# Altium footprint library SAMTEC THD.PcbLib: 161 footprints (part 12 of 12) (continued)
## SAMTEC_TSW-120-08-L-D-RA [mm] "40 Contacts - Pitch 2.54mm - Dual Row Through Mount  Right Angle Header (Post Lead 5.84mm, Tail Lead 5.08mm, Insulator 2.54mm)"
height 5.56
pads (40):
  round 1.7 hole 1: 1(-24.13,-1.27) 2(-24.13,1.27) 3(-21.59,-1.27) 4(-21.59,1.27) 5(-19.05,-1.27) 6(-19.05,1.27) 7(-16.51,-1.27) 8(-16.51,1.27) 9(-13.97,-1.27) 10(-13.97,1.27) 11(-11.43,-1.27) 12(-11.43,1.27) 13(-8.89,-1.27) 14(-8.89,1.27) 15(-6.35,-1.27) 16(-6.35,1.27) 17(-3.81,-1.27) 18(-3.81,1.27) 19(-1.27,-1.27) 20(-1.27,1.27) 21(1.27,-1.27) 22(1.27,1.27) 23(3.81,-1.27) 24(3.81,1.27) 25(6.35,-1.27) 26(6.35,1.27) 27(8.89,-1.27) 28(8.89,1.27) 29(11.43,-1.27) 30(11.43,1.27) 31(13.97,-1.27) 32(13.97,1.27) 33(16.51,-1.27) 34(16.51,1.27) 35(19.05,-1.27) 36(19.05,1.27) 37(21.59,-1.27) 38(21.59,1.27) 39(24.13,-1.27) 40(24.13,1.27)
Top Overlay:
  drawing of 363 lines, arcs and shapes, not listed
  text "1" at -26.377,-1.768 h1.2
Mechanical 8:
  drawing of 164 lines, arcs and shapes, not listed
Mechanical 14:
  drawing of 383 lines, arcs and shapes, not listed
  text "1" at -26.377,-1.768 h1.2
3D body "SAMTEC_TSW-120-08-L-D-RA.stp": height 5.56, standoff -2.29, extent -25.4,-1.587 25.4,11.176

## SAMTEC_TSW-120-08-T-D-RA [mm] "40 Contacts - Pitch 2.54mm - Dual Row Through Mount  Right Angle Header (Post Lead 5.84mm, Tail Lead 5.08mm, Insulator 2.54mm)"
height 5.56
pads (40):
  round 1.7 hole 1: 1(-24.13,-1.27) 2(-24.13,1.27) 3(-21.59,-1.27) 4(-21.59,1.27) 5(-19.05,-1.27) 6(-19.05,1.27) 7(-16.51,-1.27) 8(-16.51,1.27) 9(-13.97,-1.27) 10(-13.97,1.27) 11(-11.43,-1.27) 12(-11.43,1.27) 13(-8.89,-1.27) 14(-8.89,1.27) 15(-6.35,-1.27) 16(-6.35,1.27) 17(-3.81,-1.27) 18(-3.81,1.27) 19(-1.27,-1.27) 20(-1.27,1.27) 21(1.27,-1.27) 22(1.27,1.27) 23(3.81,-1.27) 24(3.81,1.27) 25(6.35,-1.27) 26(6.35,1.27) 27(8.89,-1.27) 28(8.89,1.27) 29(11.43,-1.27) 30(11.43,1.27) 31(13.97,-1.27) 32(13.97,1.27) 33(16.51,-1.27) 34(16.51,1.27) 35(19.05,-1.27) 36(19.05,1.27) 37(21.59,-1.27) 38(21.59,1.27) 39(24.13,-1.27) 40(24.13,1.27)
Top Overlay:
  drawing of 363 lines, arcs and shapes, not listed
  text "1" at -26.377,-1.768 h1.2
Mechanical 8:
  drawing of 164 lines, arcs and shapes, not listed
Mechanical 14:
  drawing of 383 lines, arcs and shapes, not listed
  text "1" at -26.377,-1.768 h1.2
3D body "SAMTEC_TSW-120-08-T-D-RA.stp": height 5.56, standoff -2.29, extent -25.4,-1.587 25.4,11.176

## SAMTEC_TSW-123-07-L-D-LL [mm] "46 Contacts, Pitch 2.54mm - Dual Row, Through Mount Straigh Header"
height 8.38
pads (46):
  round 1.7 hole 1: 1(-26.67,-1.27) 2(-26.67,1.27) 3(-24.13,-1.27) 4(-24.13,1.27) 5(-21.59,-1.27) 6(-21.59,1.27) 7(-19.05,-1.27) 8(-19.05,1.27) 9(-16.51,-1.27) 10(-16.51,1.27) 11(-13.97,-1.27) 12(-13.97,1.27) 13(-11.43,-1.27) 14(-11.43,1.27) 15(-8.89,-1.27) 16(-8.89,1.27) 17(-6.35,-1.27) 18(-6.35,1.27) 19(-3.81,-1.27) 20(-3.81,1.27) 21(-1.27,-1.27) 22(-1.27,1.27) 23(1.27,-1.27) 24(1.27,1.27) 25(3.81,-1.27) 26(3.81,1.27) 27(6.35,-1.27) 28(6.35,1.27) 29(8.89,-1.27) 30(8.89,1.27) 31(11.43,-1.27) 32(11.43,1.27) 33(13.97,-1.27) 34(13.97,1.27) 35(16.51,-1.27) 36(16.51,1.27) 37(19.05,-1.27) 38(19.05,1.27) 39(21.59,-1.27) 40(21.59,1.27) 41(24.13,-1.27) 42(24.13,1.27) 43(26.67,-1.27) 44(26.67,1.27) 45(29.21,-1.27) 46(29.21,1.27)
Top Overlay:
  drawing of 225 lines, arcs and shapes, not listed
  text "1" at -28.917,-1.768 h1.2
Mechanical 8:
  drawing of 188 lines, arcs and shapes, not listed
Mechanical 14:
  drawing of 844 lines, arcs and shapes, not listed
  text "1" at -28.917,-1.768 h1.2
3D body "SAMTEC_TSW-123-07-L-D-LL.stp": height 8.38, standoff -2.54, extent -27.94,-2.54 30.48,2.54

## SAMTEC_TSW-124-23-L-S [mm] "24 Contacts - Pitch 2.54mm - Single Row  Through Mount Straigh Header (Post Lead 5.84mm, Tail Lead 2.92mm, Insulator 2.54mm)"
height 8.38
pads (24):
  rect 1.7x1.7 hole 1: 1(0,0)
  round 1.7 hole 1: 2(2.54,0) 3(5.08,0) 4(7.62,0) 5(10.16,0) 6(12.7,0) 7(15.24,0) 8(17.78,0) 9(20.32,0) 10(22.86,0) 11(25.4,0) 12(27.94,0) 13(30.48,0) 14(33.02,0) 15(35.56,0) 16(38.1,0) 17(40.64,0) 18(43.18,0) 19(45.72,0) 20(48.26,0) 21(50.8,0) 22(53.34,0) 23(55.88,0) 24(58.45,0)
Top Overlay:
  drawing of 215 lines, arcs and shapes, not listed
Mechanical 8:
  lines w0.1: -0.5,0 0,0 ; 0,-0.5 0,0 ; 0,0.5 0,0 ; 0.5,0 0,0 ; 2.04,0 2.54,0 ; 2.54,-0.5 2.54,0 ; 2.54,0.5 2.54,0 ; 3.04,0 2.54,0 ; 4.58,0 5.08,0 ; 5.08,-0.5 5.08,0 ; 5.08,0.5 5.08,0 ; 5.58,0 5.08,0 ; 7.12,0 7.62,0 ; 7.62,-0.5 7.62,0 ; 7.62,0.5 7.62,0 ; 8.12,0 7.62,0 ; 9.66,0 10.16,0 ; 10.16,-0.5 10.16,0 ; 10.16,0.5 10.16,0 ; 10.66,0 10.16,0 ; 12.2,0 12.7,0 ; 12.7,-0.5 12.7,0 ; 12.7,0.5 12.7,0 ; 13.2,0 12.7,0 ; 14.74,0 15.24,0 ; 15.24,-0.5 15.24,0 ; 15.24,0.5 15.24,0 ; 15.74,0 15.24,0 ; 17.28,0 17.78,0 ; 17.78,-0.5 17.78,0 ; 17.78,0.5 17.78,0 ; 18.28,0 17.78,0 ; 19.82,0 20.32,0 ; 20.32,-0.5 20.32,0 ; 20.32,0.5 20.32,0 ; 20.82,0 20.32,0 ; 22.36,0 22.86,0 ; 22.86,-0.5 22.86,0 ; 22.86,0.5 22.86,0 ; 23.36,0 22.86,0 ; 24.9,0 25.4,0 ; 25.4,-0.5 25.4,0 ; 25.4,0.5 25.4,0 ; 25.9,0 25.4,0 ; 27.44,0 27.94,0 ; 27.94,-0.5 27.94,0 ; 27.94,0.5 27.94,0 ; 28.44,0 27.94,0 ; 29.98,0 30.48,0 ; 30.48,-0.5 30.48,0 ; 30.48,0.5 30.48,0 ; 30.98,0 30.48,0 ; 32.52,0 33.02,0 ; 33.02,-0.5 33.02,0 ; 33.02,0.5 33.02,0 ; 33.52,0 33.02,0 ; 35.06,0 35.56,0 ; 35.56,-0.5 35.56,0 ; 35.56,0.5 35.56,0 ; 36.06,0 35.56,0 ; 37.6,0 38.1,0 ; 38.1,-0.5 38.1,0 ; 38.1,0.5 38.1,0 ; 38.6,0 38.1,0 ; 40.14,0 40.64,0 ; 40.64,-0.5 40.64,0 ; 40.64,0.5 40.64,0 ; 41.14,0 40.64,0 ; 42.68,0 43.18,0 ; 43.18,-0.5 43.18,0 ; 43.18,0.5 43.18,0 ; 43.68,0 43.18,0 ; 45.22,0 45.72,0 ; 45.72,-0.5 45.72,0 ; 45.72,0.5 45.72,0 ; 46.22,0 45.72,0 ; 47.76,0 48.26,0 ; 48.26,-0.5 48.26,0 ; 48.26,0.5 48.26,0 ; 48.76,0 48.26,0 ; 50.3,0 50.8,0 ; 50.8,-0.5 50.8,0 ; 50.8,0.5 50.8,0 ; 51.3,0 50.8,0 ; 52.84,0 53.34,0 ; 53.34,-0.5 53.34,0 ; 53.34,0.5 53.34,0 ; 53.84,0 53.34,0 ; 55.38,0 55.88,0 ; 55.88,-0.5 55.88,0 ; 55.88,0.5 55.88,0 ; 56.38,0 55.88,0 ; 57.95,0 58.45,0 ; 58.45,-0.5 58.45,0 ; 58.45,0.5 58.45,0 ; 58.95,0 58.45,0
Mechanical 14:
  drawing of 265 lines, arcs and shapes, not listed
3D body "SAMTEC_TSW-124-23-L-S.stp": height 8.38, standoff -2.92, extent -1.27,-1.27 59.69,1.27

## SAMTEC_TSW-132-08-L-D [mm] "64 Contacts - Pitch 2.54mm - Dual Row  Through Mount Straigh Header (Post Lead 5.84mm, Tail Lead 5.08mm, Insulator 2.54mm)"
height 8.38
pads (64):
  round 1.7 hole 1: 1(-39.37,-1.27) 2(-39.37,1.27) 3(-36.83,-1.27) 4(-36.83,1.27) 5(-34.29,-1.27) 6(-34.29,1.27) 7(-31.75,-1.27) 8(-31.75,1.27) 9(-29.21,-1.27) 10(-29.21,1.27) 11(-26.67,-1.27) 12(-26.67,1.27) 13(-24.13,-1.27) 14(-24.13,1.27) 15(-21.59,-1.27) 16(-21.59,1.27) 17(-19.05,-1.27) 18(-19.05,1.27) 19(-16.51,-1.27) 20(-16.51,1.27) 21(-13.97,-1.27) 22(-13.97,1.27) 23(-11.43,-1.27) 24(-11.43,1.27) 25(-8.89,-1.27) 26(-8.89,1.27) 27(-6.35,-1.27) 28(-6.35,1.27) 29(-3.81,-1.27) 30(-3.81,1.27) 31(-1.27,-1.27) 32(-1.27,1.27) 33(1.27,-1.27) 34(1.27,1.27) 35(3.81,-1.27) 36(3.81,1.27) 37(6.35,-1.27) 38(6.35,1.27) 39(8.89,-1.27) 40(8.89,1.27) 41(11.43,-1.27) 42(11.43,1.27) 43(13.97,-1.27) 44(13.97,1.27) 45(16.51,-1.27) 46(16.51,1.27) 47(19.05,-1.27) 48(19.05,1.27) 49(21.59,-1.27) 50(21.59,1.27) 51(24.13,-1.27) 52(24.13,1.27) 53(26.67,-1.27) 54(26.67,1.27) 55(29.21,-1.27) 56(29.21,1.27) 57(31.75,-1.27) 58(31.75,1.27) 59(34.29,-1.27) 60(34.29,1.27) 61(36.83,-1.27) 62(36.83,1.27) 63(39.37,-1.27) 64(39.37,1.27)
Top Overlay:
  drawing of 253 lines, arcs and shapes, not listed
  text "1" at -41.742,-1.768 h1.2
Mechanical 8:
  drawing of 260 lines, arcs and shapes, not listed
Mechanical 14:
  drawing of 508 lines, arcs and shapes, not listed
  text "1" at -41.742,-1.768 h1.2
3D body "SAMTEC_TSW-132-08-L-D.stp": height 8.38, standoff -5.08, extent -40.64,-2.54 40.64,2.54

## SAMTEC_TSW-132-23-L-T [mm] "96 Contacts - Pitch 2.54mm - Triple Row Through Mount Straigh Header (Lead Length 2.92mm)"
height 11.3
pads (96):
  round 1.7 hole 1: 1(-39.37,-2.54) 2(-39.37,0) 3(-39.37,2.54) 4(-36.83,-2.54) 5(-36.83,0) 6(-36.83,2.54) 7(-34.29,-2.54) 8(-34.29,0) 9(-34.29,2.54) 10(-31.75,-2.54) 11(-31.75,0) 12(-31.75,2.54) 13(-29.21,-2.54) 14(-29.21,0) 15(-29.21,2.54) 16(-26.67,-2.54) 17(-26.67,0) 18(-26.67,2.54) 19(-24.13,-2.54) 20(-24.13,0) 21(-24.13,2.54) 22(-21.59,-2.54) 23(-21.59,0) 24(-21.59,2.54) 25(-19.05,-2.54) 26(-19.05,0) 27(-19.05,2.54) 28(-16.51,-2.54) 29(-16.51,0) 30(-16.51,2.54) 31(-13.97,-2.54) 32(-13.97,0) 33(-13.97,2.54) 34(-11.43,-2.54) 35(-11.43,0) 36(-11.43,2.54) 37(-8.89,-2.54) 38(-8.89,0) 39(-8.89,2.54) 40(-6.35,-2.54) 41(-6.35,0) 42(-6.35,2.54) 43(-3.81,-2.54) 44(-3.81,0) 45(-3.81,2.54) 46(-1.27,-2.54) 47(-1.27,0) 48(-1.27,2.54) 49(1.27,-2.54) 50(1.27,0) 51(1.27,2.54) 52(3.81,-2.54) 53(3.81,0) 54(3.81,2.54) 55(6.35,-2.54) 56(6.35,0) 57(6.35,2.54) 58(8.89,-2.54) 59(8.89,0) 60(8.89,2.54) 61(11.43,-2.54) 62(11.43,0) 63(11.43,2.54) 64(13.97,-2.54) 65(13.97,0) 66(13.97,2.54) 67(16.51,-2.54) 68(16.51,0) 69(16.51,2.54) 70(19.05,-2.54) 71(19.05,0) 72(19.05,2.54) 73(21.59,-2.54) 74(21.59,0) 75(21.59,2.54) 76(24.13,-2.54) 77(24.13,0) 78(24.13,2.54) 79(26.67,-2.54) 80(26.67,0) 81(26.67,2.54) 82(29.21,-2.54) 83(29.21,0) 84(29.21,2.54) 85(31.75,-2.54) 86(31.75,0) 87(31.75,2.54) 88(34.29,-2.54) 89(34.29,0) 90(34.29,2.54) 91(36.83,-2.54) 92(36.83,0) 93(36.83,2.54) 94(39.37,-2.54) 95(39.37,0) 96(39.37,2.54)
Top Overlay:
  drawing of 253 lines, arcs and shapes, not listed
  text "96" at 41.365,1.96 h1.2
  text "95" at 41.365,-0.58 h1.2
  text "1" at -41.742,-3.038 h1.2
  text "2" at -42.042,-0.498 h1.2
  text "94" at 41.365,-3.12 h1.2
  text "3" at -42.042,2.042 h1.2
Mechanical 8:
  lines w0.1: -39.87,-2.54 -39.37,-2.54 ; -39.87,0 -39.37,0 ; -39.87,2.54 -39.37,2.54 ; -39.37,-3.04 -39.37,-2.54 ; -39.37,-2.04 -39.37,-2.54 ; -39.37,-0.5 -39.37,0 ; -39.37,0.5 -39.37,0 ; -39.37,2.04 -39.37,2.54 ; -39.37,3.04 -39.37,2.54 ; -38.87,-2.54 -39.37,-2.54 ; -38.87,0 -39.37,0 ; -38.87,2.54 -39.37,2.54 ; -0.5,0 0,0 ; 0,-0.5 0,0 ; 0,0.5 0,0 ; 0.5,0 0,0 ; 38.87,-2.54 39.37,-2.54 ; 38.87,0 39.37,0 ; 38.87,2.54 39.37,2.54 ; 39.37,-3.04 39.37,-2.54 ; 39.37,-2.04 39.37,-2.54 ; 39.37,-0.5 39.37,0 ; 39.37,0.5 39.37,0 ; 39.37,2.04 39.37,2.54 ; 39.37,3.04 39.37,2.54 ; 39.87,-2.54 39.37,-2.54 ; 39.87,0 39.37,0 ; 39.87,2.54 39.37,2.54
Mechanical 14:
  drawing of 699 lines, arcs and shapes, not listed
  text "96" at 41.365,1.96 h1.2
  text "95" at 41.365,-0.58 h1.2
  text "1" at -41.742,-3.038 h1.2
  text "2" at -42.042,-0.498 h1.2
  text "94" at 41.365,-3.12 h1.2
  text "3" at -42.042,2.042 h1.2
3D body "SAMTEC_TSW-132-23-L-T.stp": height 8.38, standoff -2.92, extent -40.64,-3.81 40.64,3.81

## SAMTEC_TSW-150-25-L-D-RA [mm] "100 Contacts - Pitch 2.54mm - Double Row Through Mount Right Angle Header"
height 5.56
pads (100):
  round 1.7 hole 1: 1(62.23,1.27) 2(62.23,-1.27) 3(59.69,1.27) 4(59.69,-1.27) 5(57.15,1.27) 6(57.15,-1.27) 7(54.61,1.27) 8(54.61,-1.27) 9(52.07,1.27) 10(52.07,-1.27) 11(49.53,1.27) 12(49.53,-1.27) 13(46.99,1.27) 14(46.99,-1.27) 15(44.45,1.27) 16(44.45,-1.27) 17(41.91,1.27) 18(41.91,-1.27) 19(39.37,1.27) 20(39.37,-1.27) 21(36.83,1.27) 22(36.83,-1.27) 23(34.29,1.27) 24(34.29,-1.27) 25(31.75,1.27) 26(31.75,-1.27) 27(29.21,1.27) 28(29.21,-1.27) 29(26.67,1.27) 30(26.67,-1.27) 31(24.13,1.27) 32(24.13,-1.27) 33(21.59,1.27) 34(21.59,-1.27) 35(19.05,1.27) 36(19.05,-1.27) 37(16.51,1.27) 38(16.51,-1.27) 39(13.97,1.27) 40(13.97,-1.27) 41(11.43,1.27) 42(11.43,-1.27) 43(8.89,1.27) 44(8.89,-1.27) 45(6.35,1.27) 46(6.35,-1.27) 47(3.81,1.27) 48(3.81,-1.27) 49(1.27,1.27) 50(1.27,-1.27) 51(-1.27,1.27) 52(-1.27,-1.27) 53(-3.81,1.27) 54(-3.81,-1.27) 55(-6.35,1.27) 56(-6.35,-1.27) 57(-8.89,1.27) 58(-8.89,-1.27) 59(-11.43,1.27) 60(-11.43,-1.27) 61(-13.97,1.27) 62(-13.97,-1.27) 63(-16.51,1.27) 64(-16.51,-1.27) 65(-19.05,1.27) 66(-19.05,-1.27) 67(-21.59,1.27) 68(-21.59,-1.27) 69(-24.13,1.27) 70(-24.13,-1.27) 71(-26.67,1.27) 72(-26.67,-1.27) 73(-29.21,1.27) 74(-29.21,-1.27) 75(-31.75,1.27) 76(-31.75,-1.27) 77(-34.29,1.27) 78(-34.29,-1.27) 79(-36.83,1.27) 80(-36.83,-1.27) 81(-39.37,1.27) 82(-39.37,-1.27) 83(-41.91,1.27) 84(-41.91,-1.27) 85(-44.45,1.27) 86(-44.45,-1.27) 87(-46.99,1.27) 88(-46.99,-1.27) 89(-49.53,1.27) 90(-49.53,-1.27) 91(-52.07,1.27) 92(-52.07,-1.27) 93(-54.61,1.27) 94(-54.61,-1.27) 95(-57.15,1.27) 96(-57.15,-1.27) 97(-59.69,1.27) 98(-59.69,-1.27) 99(-62.23,1.27) 100(-62.23,-1.27)
Top Overlay:
  drawing of 255 lines, arcs and shapes, not listed
  text "2" at 63.748,-1.668 h1.2
  text "1" at 64.055,2.14 h1.2
  text "100" at -66.35,-1.81 h1.2
  text "99" at -65.45,0.815 h1.2
Mechanical 8:
  drawing of 404 lines, arcs and shapes, not listed
Mechanical 14:
  drawing of 605 lines, arcs and shapes, not listed
  text "2" at 63.748,-1.668 h1.2
  text "1" at 64.055,2.14 h1.2
  text "100" at -66.35,-1.81 h1.2
  text "99" at -65.45,0.815 h1.2
3D body "SAMTEC_TSW-150-25-L-D-RA.stp": height 5.56, standoff -2.54, extent -63.5,-1.587 63.5,13.462

## SAMTEC_USB3-B-S-F-TH [mm] "Right Angle, Shielded USB 3.0 Standard B Receptacle"
height 12.9
pads (11):
  round 1.6 hole 0.9: 1(1.25,1) 2(-1.25,1) 3(-1.25,-1) 4(1.25,-1)
  round 1.4 hole 0.7: 5(-4.25,3) 6(-2.5,3) 7(0,3) 8(2.5,3) 9(4.25,3)
  round 3 hole 2.3: 10(-6.02,-3.71) 10(6.02,-3.71)
Top Overlay:
  lines w0.2: -6,-5.61 -6,-13.415 ; -6,-1.81 -6,4.235 6,4.235 6,-1.81 ; -6,3.935 -4.829,3.935 ; -5.7,-13.415 ccw(c-5.4,-13.415) -5.4,-13.715 -3.45,-13.715 ; -5.5,3.935 -5.5,4.235 ; -5.4,-13.415 -5.4,-5.506 ; -5.4,-1.914 -5.4,3.935 ; -5.2,-13.715 -5.2,-13.415 -6,-13.415 ; -2.9,-14.015 -5.4,-14.015 cw(c-5.4,-13.415) -6,-13.415 ; -2.9,-13.953 ccw(c-2.619,-13.932) -2.6,-14.213 ; -2.9,-13.79 2.9,-13.785 ; -2.9,-13.714 -3.45,-13.715 ; -2.9,-13.635 2.9,-13.635 ; 2.6,-14.213 ccw(c2.619,-13.932) 2.9,-13.953 ; 2.9,-14.015 5.4,-14.015 ccw(c5.4,-13.415) 6,-13.415 ; 2.9,-13.714 3.45,-13.715 ; 4.829,3.935 6,3.935 ; 5.19,-13.715 5.2,-13.415 6,-13.415 ; 5.4,-13.415 5.4,-5.506 ; 5.4,-1.914 5.4,3.935 ; 5.5,3.935 5.5,4.235 ; 5.7,-13.415 cw(c5.4,-13.415) 5.4,-13.715 3.45,-13.715 ; 6,-5.61 6,-13.415 ; -3.45,-13.715 ccw(c-3.45,-13.565) -3.3,-13.565 cw(c-3.15,-13.565) -3.15,-13.415 -3.05,-13.415 cw(c-3.05,-13.565) -2.9,-13.565 -2.9,-14.103 ccw(c-2.619,-14.082) -2.6,-14.363 ; -2.6,-14.363 2.6,-14.363 ; -2.6,-14.363 -2.6,-14.213 ; -2.6,-14.213 2.6,-14.214 2.6,-14.363 ; 2.6,-14.363 ccw(c2.619,-14.082) 2.9,-14.103 2.9,-13.953 ; 2.9,-13.953 2.9,-13.565 cw(c3.05,-13.565) 3.05,-13.415 3.15,-13.415 cw(c3.15,-13.565) 3.3,-13.565 ccw(c3.45,-13.565) 3.45,-13.715
Mechanical 8:
  lines w0.1: -6.52,-3.71 -6.02,-3.71 ; -6.02,-4.21 -6.02,-3.71 ; -6.02,-3.21 -6.02,-3.71 ; -5.52,-3.71 -6.02,-3.71 ; -4.75,3 -4.25,3 ; -4.25,2.5 -4.25,3 ; -4.25,3.5 -4.25,3 ; -3.75,3 -4.25,3 ; -3,3 -2.5,3 ; -2.5,2.5 -2.5,3 ; -2.5,3.5 -2.5,3 ; -2,3 -2.5,3 ; -1.75,-1 -1.25,-1 ; -1.75,1 -1.25,1 ; -1.25,-1.5 -1.25,-1 ; -1.25,-0.5 -1.25,-1 ; -1.25,0.5 -1.25,1 ; -1.25,1.5 -1.25,1 ; -0.75,-1 -1.25,-1 ; -0.75,1 -1.25,1 ; -0.5,0 0,0 ; -0.5,3 0,3 ; 0,-0.5 0,0 ; 0,0.5 0,0 ; 0,2.5 0,3 ; 0,3.5 0,3 ; 0.5,0 0,0 ; 0.5,3 0,3 ; 0.75,-1 1.25,-1 ; 0.75,1 1.25,1 ; 1.25,-1.5 1.25,-1 ; 1.25,-0.5 1.25,-1 ; 1.25,0.5 1.25,1 ; 1.25,1.5 1.25,1 ; 1.75,-1 1.25,-1 ; 1.75,1 1.25,1 ; 2,3 2.5,3 ; 2.5,2.5 2.5,3 ; 2.5,3.5 2.5,3 ; 3,3 2.5,3 ; 3.75,3 4.25,3 ; 4.25,2.5 4.25,3 ; 4.25,3.5 4.25,3 ; 4.75,3 4.25,3 ; 5.52,-3.71 6.02,-3.71 ; 6.02,-4.21 6.02,-3.71 ; 6.02,-3.21 6.02,-3.71 ; 6.52,-3.71 6.02,-3.71
Mechanical 14:
  lines w0.1: -6,-5.015 ccw(c-6.093,-5.018) -6.026,-4.953 -7.201,-4.348 -7.252,-4.326 -7.252,-3.104 -7.201,-3.082 ; -6,-2.415 cw(c-6.093,-2.412) -6.026,-2.477 ; -6,3.935 6,3.935 ; -5.7,-13.415 ccw(c-5.4,-13.415) -5.4,-13.715 -3.45,-13.715 ; -5.5,3.935 -5.5,4.235 ; -5.4,-13.415 -5.4,3.935 ; -5.2,-13.715 -5.2,-13.415 -6,-13.415 ; -3.8,3.935 -3.8,4.235 ; -3.5,3.935 -3.5,4.235 ; -2.9,-14.015 -5.4,-14.015 cw(c-5.4,-13.415) -6,-13.415 ; -2.9,-13.953 ccw(c-2.619,-13.932) -2.6,-14.213 ; -2.9,-13.79 2.9,-13.785 ; -2.9,-13.714 -3.45,-13.715 ; -2.9,-13.635 2.9,-13.635 ; 2.6,-14.213 ccw(c2.619,-13.932) 2.9,-13.953 ; 2.9,-14.015 5.4,-14.015 ccw(c5.4,-13.415) 6,-13.415 ; 2.9,-13.714 3.45,-13.715 ; 3.5,3.935 3.5,4.235 ; 3.8,3.935 3.8,4.235 ; 5.19,-13.715 5.2,-13.415 6,-13.415 ; 5.4,-13.415 5.4,3.935 ; 5.5,3.935 5.5,4.235 ; 5.7,-13.415 cw(c5.4,-13.415) 5.4,-13.715 3.45,-13.715 ; 6,-5.015 cw(c6.093,-5.018) 6.026,-4.953 7.201,-4.348 7.252,-4.326 7.252,-3.104 7.201,-3.082 ; 6,-2.415 ccw(c6.093,-2.412) 6.026,-2.477 ; -7.201,-3.082 -6.026,-2.477 ; -7.201,-3.082 -6.026,-2.477 ; -6,-13.415 -6,4.235 6,4.235 6,-13.415 ; -3.45,-13.715 ccw(c-3.45,-13.565) -3.3,-13.565 cw(c-3.15,-13.565) -3.15,-13.415 -3.05,-13.415 cw(c-3.05,-13.565) -2.9,-13.565 -2.9,-14.103 ccw(c-2.619,-14.082) -2.6,-14.363 ; -2.6,-14.363 2.6,-14.363 ; -2.6,-14.363 -2.6,-14.213 ; -2.6,-14.213 2.6,-14.214 2.6,-14.363 ; 2.6,-14.363 ccw(c2.619,-14.082) 2.9,-14.103 2.9,-13.953 ; 2.9,-13.953 2.9,-13.565 cw(c3.05,-13.565) 3.05,-13.415 3.15,-13.415 cw(c3.15,-13.565) 3.3,-13.565 ccw(c3.45,-13.565) 3.45,-13.715 ; 6.026,-2.477 7.201,-3.082 ; 6.026,-2.477 7.201,-3.082
3D body "SAMTEC_USB3-B-S-F-TH.stp": height 13.19, standoff -3.04, extent -7.252,-14.363 7.252,4.235

## SAMTEC_VHDCR-68-01-M-RA [mm] "68 Positions, Pitch 0.8mm, Very Hight Density Right Angle Connector, VHDCR Series"
height 6
pads (72):
  round 1.05 hole 0.65: 1(-13,-2.35) 2(-12.2,-1.2) 3(-11.4,-2.35) 4(-10.6,-1.2) 5(-9.8,-2.35) 6(-9,-1.2) 7(-8.2,-2.35) 8(-7.4,-1.2) 9(-6.6,-2.35) 10(-5.8,-1.2) 11(-5,-2.35) 12(-4.2,-1.2) 13(-3.4,-2.35) 14(-2.6,-1.2) 15(-1.8,-2.35) 16(-1,-1.2) 17(-0.2,-2.35) 18(0.6,-1.2) 19(1.4,-2.35) 20(2.2,-1.2) 21(3,-2.35) 22(3.8,-1.2) 23(4.6,-2.35) 24(5.4,-1.2) 25(6.2,-2.35) 26(7,-1.2) 27(7.8,-2.35) 28(8.6,-1.2) 29(9.4,-2.35) 30(10.2,-1.2) 31(11,-2.35) 32(11.8,-1.2) 33(12.6,-2.35) 34(13.4,-1.2) 35(-13.4,0) 36(-12.6,1.15) 37(-11.8,0) 38(-11,1.15) 39(-10.2,0) 40(-9.4,1.15) 41(-8.6,0) 42(-7.8,1.15) 43(-7,0) 44(-6.2,1.15) 45(-5.4,0) 46(-4.6,1.15) 47(-3.8,0) 48(-3,1.15) 49(-2.2,0) 50(-1.4,1.15) 51(-0.6,0) 52(0.2,1.15) 53(1,0) 54(1.8,1.15) 55(2.6,0) 56(3.4,1.15) 57(4.2,0) 58(5,1.15) 59(5.8,0) 60(6.6,1.15) 61(7.4,0) 62(8.2,1.15) 63(9,0) 64(9.8,1.15) 65(10.6,0) 66(11.4,1.15) 67(12.2,0) 68(13,1.15)
  round 2.3 hole 1.2: 69(16.17,-0.105) 70(-16.17,-0.105)
  round 0.5 hole 1.8 unplated mask+0.65: 71(20.95,2.51) 72(-20.95,2.51)
Top Layer:
  region: 17.42,-2.557 17.42,-0.757 17.489,-0.603 17.57,-0.274 17.57,0.064 17.489,0.393 17.42,0.547 17.42,2.347 19.701,2.347 19.733,2.185 19.858,1.881 20.059,1.619 20.321,1.419 20.625,1.293 20.952,1.25 21.279,1.294 21.583,1.421 21.72,1.513 21.72,-2.557
  region: -17.42,-2.557 -17.42,-0.757 -17.489,-0.603 -17.57,-0.274 -17.57,0.064 -17.489,0.393 -17.42,0.547 -17.42,2.347 -19.701,2.347 -19.733,2.185 -19.858,1.881 -20.059,1.619 -20.321,1.419 -20.625,1.293 -20.952,1.25 -21.279,1.294 -21.583,1.421 -21.72,1.513 -21.72,-2.557
Top Overlay:
  lines w0.2: -21.35,6.144 21.35,6.144 ; -21.349,3.705 -21.348,6.144 cw(c-21.048,6.144) -21.048,6.444 21.05,6.444 cw(c21.05,6.144) 21.35,6.144 21.35,3.705 ; -20.797,6.444 -20.797,7.584 -16.903,7.584 ; -20.4,7.584 -20.4,9.114 ; -17.845,11.124 -18.49,11.124 -18.49,10.124 -19.21,10.124 -19.21,11.124 -19.855,11.124 -20.765,9.714 ; -17.845,11.124 -16.938,9.714 ; -17.302,9.114 -17.3,7.584 ; -17.1,-1.314 -17.1,-3.005 -13.5,-3.005 ; -16.903,6.444 -16.9,7.584 ; -15.408,6.444 -15.408,11.144 cw(c-14.908,11.144) -14.908,11.644 15.325,11.644 cw(c15.325,11.144) 15.825,11.144 15.825,6.444 ; -14.7,-3.005 -14.7,2.435 14.7,2.435 14.7,-3.005 ; 13.5,-3.005 17.1,-3.005 17.1,-1.314 ; 16.9,7.584 16.903,6.444 ; 16.903,7.584 20.797,7.584 20.797,6.444 ; 17.3,7.584 17.302,9.114 ; 17.845,11.124 16.938,9.714 ; 17.845,11.124 18.49,11.124 18.49,10.124 19.21,10.124 19.21,11.124 19.855,11.124 20.765,9.714 ; 20.4,7.584 20.4,9.114 ; -20.765,9.714 -16.938,9.714 ; -20.765,9.714 -20.765,9.114 -16.938,9.114 -16.938,9.714 ; 16.938,9.714 20.765,9.714 ; 16.938,9.714 16.938,9.114 20.765,9.114 20.765,9.714
  text "68" at 12.111,2.961 h1.2
  text "33" at 11.625,-4.671 h1.2
  text "36" at -13.45,3.061 h1.2
  text "1" at -13.154,-4.673 h1.2
Top Solder:
  region: -21.847,-2.684 -17.293,-2.684 -17.293,-0.725 -17.362,-0.579 -17.443,-0.266 -17.443,0.056 -17.362,0.369 -17.293,0.515 -17.293,2.474 -19.818,2.474 -19.827,2.359 -19.881,2.134 -19.98,1.925 -20.119,1.74 -20.292,1.588 -20.493,1.473 -20.713,1.402 -20.943,1.377 -21.173,1.399 -21.394,1.468 -21.596,1.579 -21.772,1.73 -21.847,1.818
  region: 17.293,-2.684 21.847,-2.684 21.847,1.818 21.772,1.73 21.596,1.579 21.394,1.468 21.173,1.399 20.943,1.377 20.713,1.402 20.493,1.473 20.292,1.588 20.119,1.74 19.98,1.925 19.881,2.134 19.827,2.359 19.818,2.474 17.293,2.474 17.293,0.515 17.362,0.369 17.443,0.056 17.443,-0.266 17.362,-0.579 17.293,-0.725
Mechanical 8:
  drawing of 614 lines, arcs and shapes, not listed
Mechanical 14:
  lines w0.1: -21.35,6.144 21.35,6.144 ; -20.797,6.444 -20.797,7.584 -16.903,7.584 ; -20.4,7.584 -20.4,9.114 ; -17.845,11.124 -18.49,11.124 -18.49,10.124 -19.21,10.124 -19.21,11.124 -19.855,11.124 -20.765,9.714 ; -17.845,11.124 -16.938,9.714 ; -17.302,9.114 -17.3,7.584 ; -17.1,-1.755 -19.275,-1.755 cw(c-19.275,-1.255) -19.775,-1.255 -19.775,1.045 cw(c-19.275,1.045) -19.275,1.545 -17.1,1.545 ; -17.1,-1.205 -19.075,-1.205 cw(c-19.075,-1.005) -19.275,-1.005 -19.275,0.795 cw(c-19.075,0.795) -19.075,0.995 -17.1,0.995 ; -16.903,6.444 -16.9,7.584 ; -15.408,6.444 -15.408,11.144 cw(c-14.908,11.144) -14.908,11.644 15.325,11.644 cw(c15.325,11.144) 15.825,11.144 15.825,6.444 ; -14.7,-3.005 -14.7,2.435 14.7,2.435 14.7,-3.005 17.1,-3.005 ; 16.9,7.584 16.903,6.444 ; 16.903,7.584 20.797,7.584 20.797,6.444 ; 17.1,-1.755 19.275,-1.755 ccw(c19.275,-1.255) 19.775,-1.255 19.775,1.045 ccw(c19.275,1.045) 19.275,1.545 17.1,1.545 ; 17.1,-1.205 19.075,-1.205 ccw(c19.075,-1.005) 19.275,-1.005 19.275,0.795 ccw(c19.075,0.795) 19.075,0.995 17.1,0.995 ; 17.3,7.584 17.302,9.114 ; 17.845,11.124 16.938,9.714 ; 17.845,11.124 18.49,11.124 18.49,10.124 19.21,10.124 19.21,11.124 19.855,11.124 20.765,9.714 ; 20.4,7.584 20.4,9.114 ; -20.765,9.714 -16.938,9.714 ; -20.765,9.714 -20.765,9.114 -16.938,9.114 -16.938,9.714 ; 16.938,9.714 20.765,9.714 ; 16.938,9.714 16.938,9.114 20.765,9.114 20.765,9.714 ; 17.1,-3.005 17.1,1.81 21.35,1.81 21.35,6.144 ccw(c21.05,6.144) 21.05,6.444 -21.048,6.444 ccw(c-21.048,6.144) -21.348,6.144 -21.35,1.81 -17.1,1.81 -17.1,-3.005 17.1,-3.005
  text "68" at 12.111,2.961 h1.2
  text "33" at 11.625,-4.671 h1.2
  text "36" at -13.45,3.061 h1.2
  text "1" at -13.154,-4.673 h1.2
3D body "SAMTEC_VHDCR-68-01-M-RA.stp": height 6, standoff -3.7, extent -21.35,-3.005 21.35,11.644